# Altium integrated library Wurth Electronik Socket Header 6130xx11821.IntLib: 197 symbols (part 1 of 2) (continued)
## WE-2.54 mm Socket Header 613040143121 (continued)
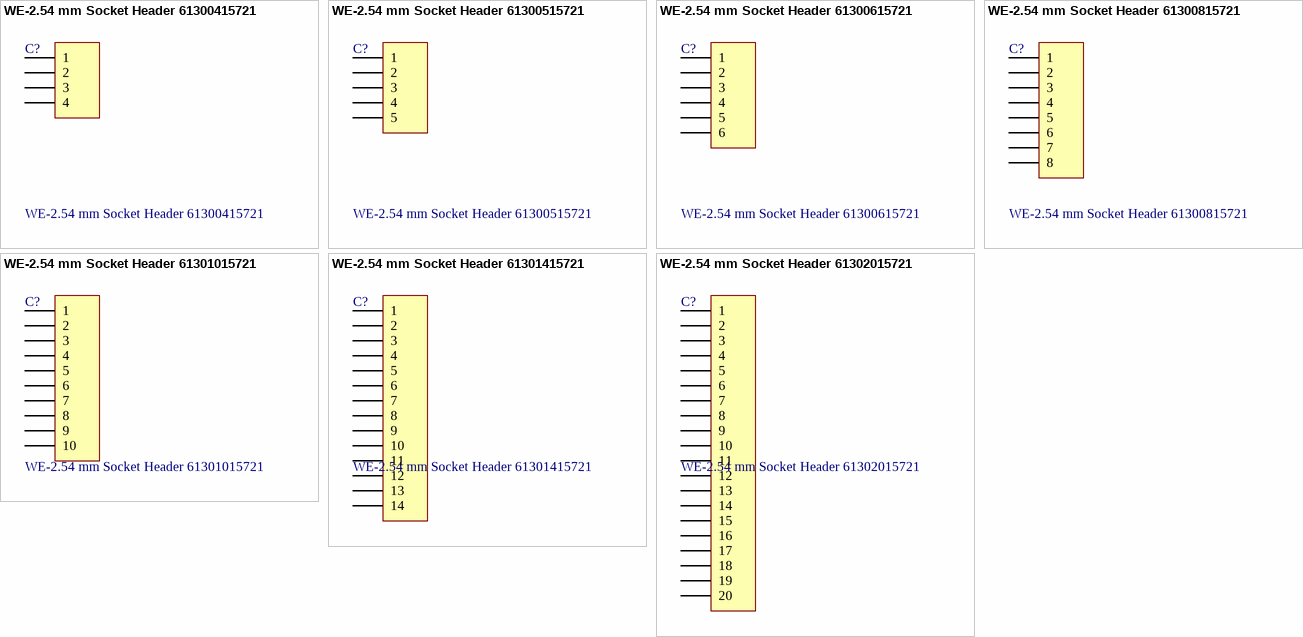
[diagram p9: symbols WE-2.54 mm Socket Header 61300415721 to WE-2.54 mm Socket Header 61302015721]

## WE-2.54 mm Socket Header 61300415721
designator C?
WR-PHD 2.54 mm Socket Header Bottom Entry; Manufacturer: Würth Elektronik eiSos GmbH; ComponentLink1 Description: Manufacturer; ComponentLink2 Description: Datasheet; NoPins: 04; Created Date: 1 April 2013; partNo: 61300415721; ComponentLink1URL: http://www.we-online.com; ComponentLink2URL: http://katalog.we-online.de/em/datasheet/6130xx15721.pdf; Created by: Karrer Zheng
footprint 61300415721 (4 pins, 1 row, straight, gold plating)
pins: 1, 2, 3, 4

## WE-2.54 mm Socket Header 61300515721
designator C?
WR-PHD 2.54 mm Socket Header Bottom Entry; Manufacturer: Würth Elektronik eiSos GmbH; ComponentLink1 Description: Manufacturer; ComponentLink2 Description: Datasheet; NoPins: 05; Created Date: 1 April 2013; partNo: 61300515721; ComponentLink1URL: http://www.we-online.com; ComponentLink2URL: http://katalog.we-online.de/em/datasheet/6130xx15721.pdf; Created by: Karrer Zheng
footprint 61300515721 (5 pins, 1 row, straight, gold plating)
pins: 1, 2, 3, 4, 5

## WE-2.54 mm Socket Header 61300615721
designator C?
WR-PHD 2.54 mm Socket Header Bottom Entry; Manufacturer: Würth Elektronik eiSos GmbH; ComponentLink1 Description: Manufacturer; ComponentLink2 Description: Datasheet; NoPins: 06; Created Date: 1 April 2013; partNo: 61300615721; ComponentLink1URL: http://www.we-online.com; ComponentLink2URL: http://katalog.we-online.de/em/datasheet/6130xx15721.pdf; Created by: Karrer Zheng
footprint 61300615721 (6 pins, 1 row, straight, gold plating)
pins: 1, 2, 3, 4, 5, 6

## WE-2.54 mm Socket Header 61300815721
designator C?
WR-PHD 2.54 mm Socket Header Bottom Entry; Manufacturer: Würth Elektronik eiSos GmbH; ComponentLink1 Description: Manufacturer; ComponentLink2 Description: Datasheet; NoPins: 08; Created Date: 1 April 2013; partNo: 61300815721; ComponentLink1URL: http://www.we-online.com; ComponentLink2URL: http://katalog.we-online.de/em/datasheet/6130xx15721.pdf; Created by: Karrer Zheng
footprint 61300815721 (8 pins, 1 row, straight, gold plating)
pins: 1, 2, 3, 4, 5, 6, 7, 8

## WE-2.54 mm Socket Header 61301015721
designator C?
WR-PHD 2.54 mm Socket Header Bottom Entry; Manufacturer: Würth Elektronik eiSos GmbH; ComponentLink1 Description: Manufacturer; ComponentLink2 Description: Datasheet; NoPins: 10; Created Date: 1 April 2013; partNo: 61301015721; ComponentLink1URL: http://www.we-online.com; ComponentLink2URL: http://katalog.we-online.de/em/datasheet/6130xx15721.pdf; Created by: Karrer Zheng
footprint 61301015721 (10 pins, 1 row, straight, gold plating)
pins: 1, 2, 3, 4, 5, 6, 7, 8, 9, 10

## WE-2.54 mm Socket Header 61301415721
designator C?
WR-PHD 2.54 mm Socket Header Bottom Entry; Manufacturer: Würth Elektronik eiSos GmbH; ComponentLink1 Description: Manufacturer; ComponentLink2 Description: Datasheet; NoPins: 14; Created Date: 1 April 2013; partNo: 61301415721; ComponentLink1URL: http://www.we-online.com; ComponentLink2URL: http://katalog.we-online.de/em/datasheet/6130xx15721.pdf; Created by: Karrer Zheng
footprint 61301415721 (14 pins, 1 row, straight, gold plating)
pins: 1, 2, 3, 4, 5, 6, 7, 8, 9, 10, 11, 12, 13, 14

## WE-2.54 mm Socket Header 61302015721
designator C?
WR-PHD 2.54 mm Socket Header Bottom Entry; Manufacturer: Würth Elektronik eiSos GmbH; ComponentLink1 Description: Manufacturer; ComponentLink2 Description: Datasheet; NoPins: 20; Created Date: 1 April 2013; partNo: 61302015721; ComponentLink1URL: http://www.we-online.com; ComponentLink2URL: http://katalog.we-online.de/em/datasheet/6130xx15721.pdf; Created by: Karrer Zheng
footprint 61302015721 (20 pins, 1 row, straight, gold plating)
pins: 1, 2, 3, 4, 5, 6, 7, 8, 9, 10, 11, 12, 13, 14, 15, 16, 17, 18, 19, 20


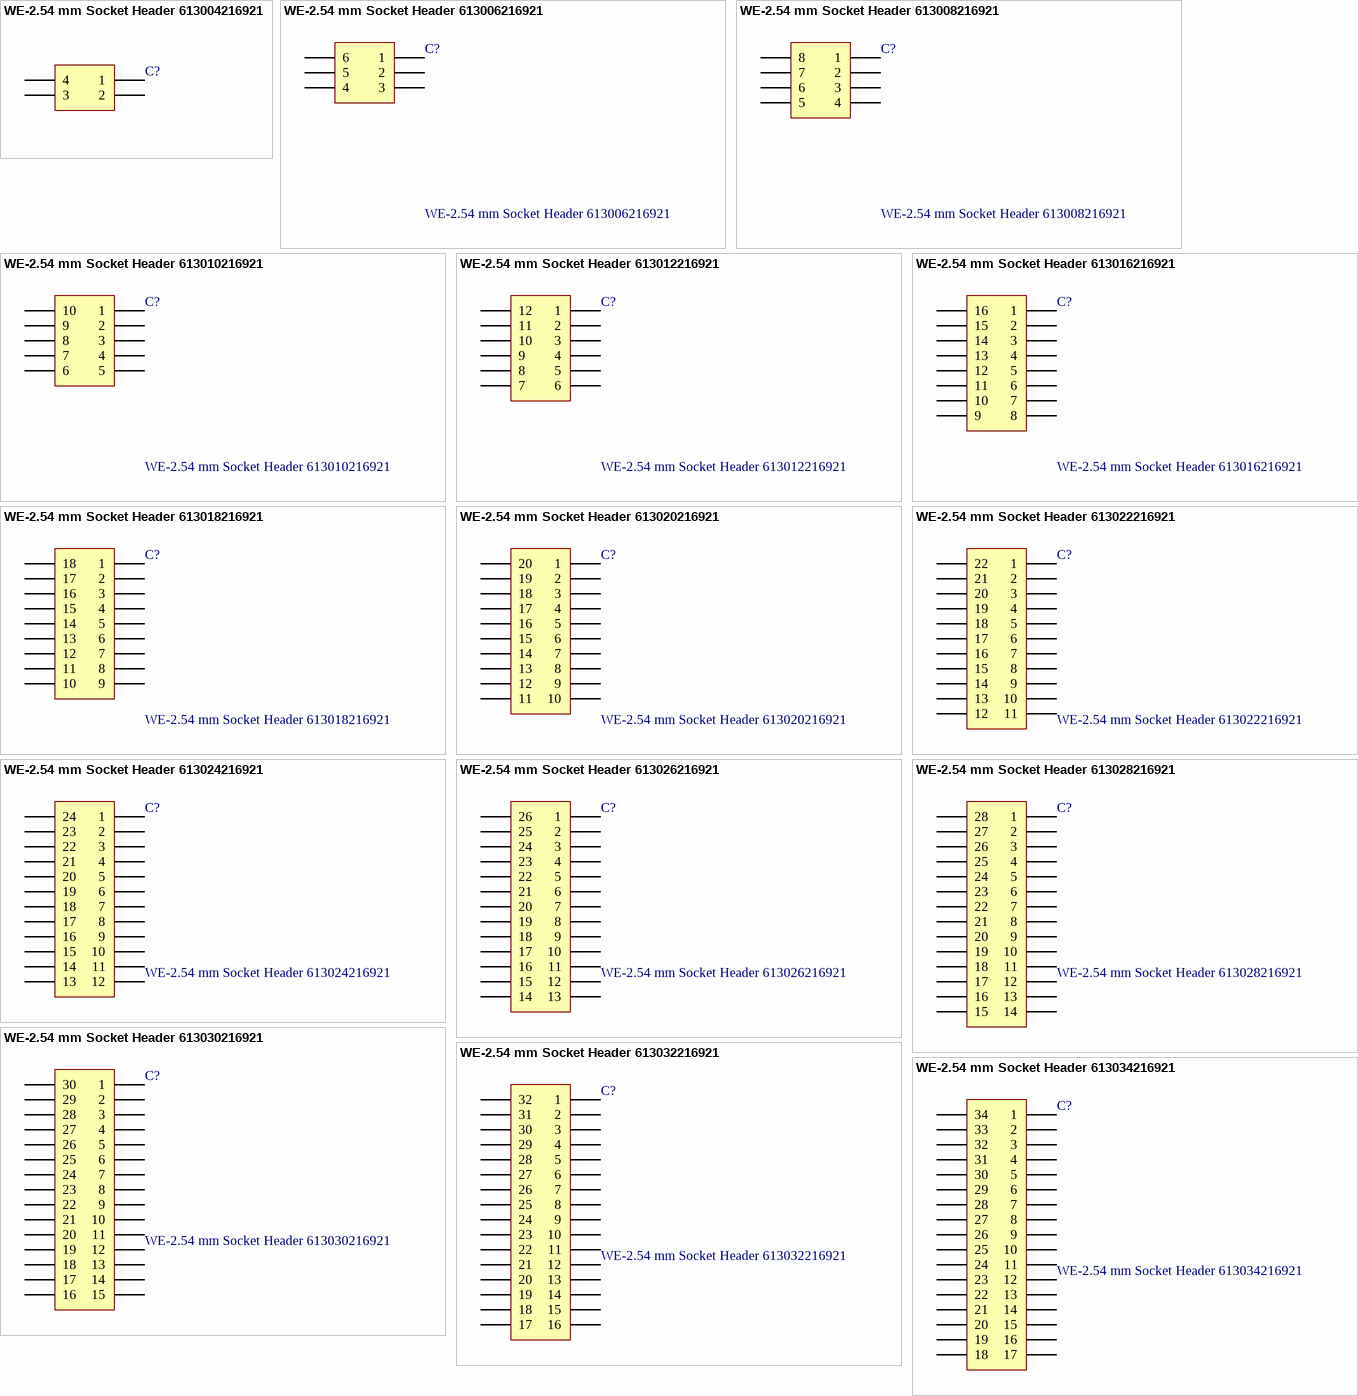
[diagram p10: symbols WE-2.54 mm Socket Header 613004216921 to WE-2.54 mm Socket Header 613034216921]

## WE-2.54 mm Socket Header 613004216921
designator C?
WR-PHD 2.54 mm Dual Socket Header Bottom Entry Large; Manufacturer: Würth Elektronik eiSos GmbH; ComponentLink1 Description: Manufacturer; ComponentLink2 Description: Datasheet; NoPins: 04; Created Date: 29 March 2013; partNo: 613004216921; ComponentLink1URL: http://www.we-online.com; ComponentLink2URL: http://katalog.we-online.de/em/datasheet/6130xx216921.pdf; Created by: Karrer Zheng
footprint 613004216921 (Large, 4 pins, dual row, straight, gold plating)
pins: 1, 2, 3, 4

## WE-2.54 mm Socket Header 613006216921
designator C?
WR-PHD 2.54 mm Dual Socket Header Bottom Entry Large; Manufacturer: Würth Elektronik eiSos GmbH; ComponentLink1 Description: Manufacturer; ComponentLink2 Description: Datasheet; NoPins: 06; Created Date: 29 March 2013; partNo: 613006216921; ComponentLink1URL: http://www.we-online.com; ComponentLink2URL: http://katalog.we-online.de/em/datasheet/6130xx216921.pdf; Created by: Karrer Zheng
footprint 613006216921 (Large, 6 pins, dual row, straight, gold plating)
pins: 1, 2, 3, 4, 5, 6

## WE-2.54 mm Socket Header 613008216921
designator C?
WR-PHD 2.54 mm Dual Socket Header Bottom Entry Large; Manufacturer: Würth Elektronik eiSos GmbH; ComponentLink1 Description: Manufacturer; ComponentLink2 Description: Datasheet; NoPins: 08; Created Date: 29 March 2013; partNo: 613008216921; ComponentLink1URL: http://www.we-online.com; ComponentLink2URL: http://katalog.we-online.de/em/datasheet/6130xx216921.pdf; Created by: Karrer Zheng
footprint 613008216921 (Large, 8 pins, dual row, straight, gold plating)
pins: 1, 2, 3, 4, 5, 6, 7, 8

## WE-2.54 mm Socket Header 613010216921
designator C?
WR-PHD 2.54 mm Dual Socket Header Bottom Entry Large; Manufacturer: Würth Elektronik eiSos GmbH; ComponentLink1 Description: Manufacturer; ComponentLink2 Description: Datasheet; NoPins: 10; Created Date: 29 March 2013; partNo: 613010216921; ComponentLink1URL: http://www.we-online.com; ComponentLink2URL: http://katalog.we-online.de/em/datasheet/6130xx216921.pdf; Created by: Karrer Zheng
footprint 613010216921 (Large, 10 pins, dual row, straight, gold plating)
pins: 1, 2, 3, 4, 5, 6, 7, 8, 9, 10

## WE-2.54 mm Socket Header 613012216921
designator C?
WR-PHD 2.54 mm Dual Socket Header Bottom Entry Large; Manufacturer: Würth Elektronik eiSos GmbH; ComponentLink1 Description: Manufacturer; ComponentLink2 Description: Datasheet; NoPins: 12; Created Date: 29 March 2013; partNo: 613012216921; ComponentLink1URL: http://www.we-online.com; ComponentLink2URL: http://katalog.we-online.de/em/datasheet/6130xx216921.pdf; Created by: Karrer Zheng
footprint 613012216921 (Large, 12 pins, dual row, straight, gold plating)
pins: 1, 2, 3, 4, 5, 6, 7, 8, 9, 10, 11, 12

## WE-2.54 mm Socket Header 613016216921
designator C?
WR-PHD 2.54 mm Dual Socket Header Bottom Entry Large; Manufacturer: Würth Elektronik eiSos GmbH; ComponentLink1 Description: Manufacturer; ComponentLink2 Description: Datasheet; NoPins: 16; Created Date: 29 March 2013; partNo: 613016216921; ComponentLink1URL: http://www.we-online.com; ComponentLink2URL: http://katalog.we-online.de/em/datasheet/6130xx216921.pdf; Created by: Karrer Zheng
footprint 613016216921 (Large, 16 pins, dual row, straight, gold plating)
pins: 1, 2, 3, 4, 5, 6, 7, 8, 9, 10, 11, 12, 13, 14, 15, 16

## WE-2.54 mm Socket Header 613018216921
designator C?
WR-PHD 2.54 mm Dual Socket Header Bottom Entry Large; Manufacturer: Würth Elektronik eiSos GmbH; ComponentLink1 Description: Manufacturer; ComponentLink2 Description: Datasheet; NoPins: 18; Created Date: 29 March 2013; partNo: 613018216921; ComponentLink1URL: http://www.we-online.com; ComponentLink2URL: http://katalog.we-online.de/em/datasheet/6130xx216921.pdf; Created by: Karrer Zheng
footprint 613018216921 (Large, 18 pins, dual row, straight, gold plating)
pins: 1, 2, 3, 4, 5, 6, 7, 8, 9, 10, 11, 12, 13, 14, 15, 16, 17, 18

## WE-2.54 mm Socket Header 613020216921
designator C?
WR-PHD 2.54 mm Dual Socket Header Bottom Entry Large; Manufacturer: Würth Elektronik eiSos GmbH; ComponentLink1 Description: Manufacturer; ComponentLink2 Description: Datasheet; NoPins: 20; Created Date: 29 March 2013; partNo: 613020216921; ComponentLink1URL: http://www.we-online.com; ComponentLink2URL: http://katalog.we-online.de/em/datasheet/6130xx216921.pdf; Created by: Karrer Zheng
footprint 613020216921 (Large, 20 pins, dual row, straight, gold plating)
pins: 1, 2, 3, 4, 5, 6, 7, 8, 9, 10, 11, 12, 13, 14, 15, 16, 17, 18, 19, 20

## WE-2.54 mm Socket Header 613022216921
designator C?
WR-PHD 2.54 mm Dual Socket Header Bottom Entry Large; Manufacturer: Würth Elektronik eiSos GmbH; ComponentLink1 Description: Manufacturer; ComponentLink2 Description: Datasheet; NoPins: 22; Created Date: 29 March 2013; partNo: 613022216921; ComponentLink1URL: http://www.we-online.com; ComponentLink2URL: http://katalog.we-online.de/em/datasheet/6130xx216921.pdf; Created by: Karrer Zheng
footprint 613022216921 (Large, 22 pins, dual row, straight, gold plating)
pins: 1, 2, 3, 4, 5, 6, 7, 8, 9, 10, 11, 12, 13, 14, 15, 16, 17, 18, 19, 20, 21, 22

## WE-2.54 mm Socket Header 613024216921
designator C?
WR-PHD 2.54 mm Dual Socket Header Bottom Entry Large; Manufacturer: Würth Elektronik eiSos GmbH; ComponentLink1 Description: Manufacturer; ComponentLink2 Description: Datasheet; NoPins: 24; Created Date: 29 March 2013; partNo: 613024216921; ComponentLink1URL: http://www.we-online.com; ComponentLink2URL: http://katalog.we-online.de/em/datasheet/6130xx216921.pdf; Created by: Karrer Zheng
footprint 613024216921 (Large, 24 pins, dual row, straight, gold plating)
pins: 1, 2, 3, 4, 5, 6, 7, 8, 9, 10, 11, 12, 13, 14, 15, 16, 17, 18, 19, 20, 21, 22, 23, 24

## WE-2.54 mm Socket Header 613026216921
designator C?
WR-PHD 2.54 mm Dual Socket Header Bottom Entry Large; Manufacturer: Würth Elektronik eiSos GmbH; ComponentLink1 Description: Manufacturer; ComponentLink2 Description: Datasheet; NoPins: 26; Created Date: 29 March 2013; partNo: 613026216921; ComponentLink1URL: http://www.we-online.com; ComponentLink2URL: http://katalog.we-online.de/em/datasheet/6130xx216921.pdf; Created by: Karrer Zheng
footprint 613026216921 (Large,26 pins, dual row, straight, gold plating)
pins: 1, 2, 3, 4, 5, 6, 7, 8, 9, 10, 11, 12, 13, 14, 15, 16, 17, 18, 19, 20, 21, 22, 23, 24, 25, 26

## WE-2.54 mm Socket Header 613028216921
designator C?
WR-PHD 2.54 mm Dual Socket Header Bottom Entry Large; Manufacturer: Würth Elektronik eiSos GmbH; ComponentLink1 Description: Manufacturer; ComponentLink2 Description: Datasheet; NoPins: 28; Created Date: 29 March 2013; partNo: 613028216921; ComponentLink1URL: http://www.we-online.com; ComponentLink2URL: http://katalog.we-online.de/em/datasheet/6130xx216921.pdf; Created by: Karrer Zheng
footprint 613028216921 (Large, 28 pins, dual row, straight, gold plating)
pins: 1, 2, 3, 4, 5, 6, 7, 8, 9, 10, 11, 12, 13, 14, 15, 16, 17, 18, 19, 20, 21, 22, 23, 24, 25, 26, 27, 28

## WE-2.54 mm Socket Header 613030216921
designator C?
WR-PHD 2.54 mm Dual Socket Header Bottom Entry Large; Manufacturer: Würth Elektronik eiSos GmH; ComponentLink1 Description: Manufacturer; ComponentLink2 Description: Datasheet; NoPins: 30; Created Date: 29 March 2013; partNo: 613030216921; ComponentLink1URL: http://www.we-online.com; ComponentLink2URL: http://katalog.we-online.de/em/datasheet/6130xx216921.pdf; Created by: Karrer Zheng
footprint 613030216921 (Large, 30 pins, dual row, straight, gold plating)
pins: 1, 2, 3, 4, 5, 6, 7, 8, 9, 10, 11, 12, 13, 14, 15, 16, 17, 18, 19, 20, 21, 22, 23, 24, 25, 26, 27, 28, 29, 30

## WE-2.54 mm Socket Header 613032216921
designator C?
WR-PHD 2.54 mm Dual Socket Header Bottom Entry Large; Manufacturer: Würth Elektronik eiSos GmbH; ComponentLink1 Description: Manufacturer; ComponentLink2 Description: Datasheet; NoPins: 32; Created Date: 29 March 2013; partNo: 613032216921; ComponentLink1URL: http://www.we-online.com; ComponentLink2URL: http://katalog.we-online.de/em/datasheet/6130xx216921.pdf; Created by: Karrer Zheng
footprint 613032216921 (Large, 32 pins, dual row, straight, gold plating)
pins: 1, 2, 3, 4, 5, 6, 7, 8, 9, 10, 11, 12, 13, 14, 15, 16, 17, 18, 19, 20, 21, 22, 23, 24, 25, 26, 27, 28, 29, 30, 31, 32

## WE-2.54 mm Socket Header 613034216921
designator C?
WR-PHD 2.54 mm Dual Socket Header Bottom Entry Large; Manufacturer: Würth Elektronik eiSos GmbH; ComponentLink1 Description: Manufacturer; ComponentLink2 Description: Datasheet; NoPins: 34; Created Date: 29 March 2013; partNo: 613034216921; ComponentLink1URL: http://www.we-online.com; ComponentLink2URL: http://katalog.we-online.de/em/datasheet/6130xx216921.pdf; Created by: Karrer Zheng
footprint 613034216921 (Large, 34 pins, dual row, straight, gold plating)
pins: 1, 2, 3, 4, 5, 6, 7, 8, 9, 10, 11, 12, 13, 14, 15, 16, 17, 18, 19, 20, 21, 22, 23, 24, 25, 26, 27, 28, 29, 30, 31, 32, 33, 34

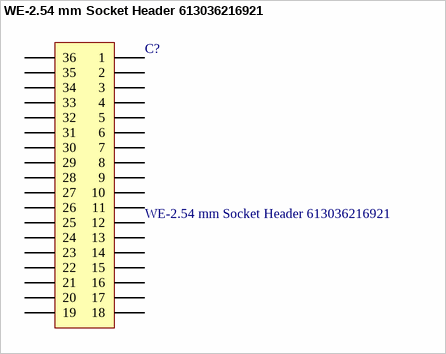
[diagram p11: symbol WE-2.54 mm Socket Header 613036216921]

## WE-2.54 mm Socket Header 613036216921
designator C?
WR-PHD 2.54 mm Dual Socket Header Bottom Entry Large; Manufacturer: Würth Elektronik eiSos GmbH; ComponentLink1 Description: Manufacturer; ComponentLink2 Description: Datasheet; NoPins: 36; Created Date: 29 March 2013; partNo: 613036216921; ComponentLink1URL: http://www.we-online.com; ComponentLink2URL: http://katalog.we-online.de/em/datasheet/6130xx216921.pdf; Created by: Karrer Zheng
footprint 613036216921 (Large, 36 pins, dual row, straight, gold plating)
pins: 1, 2, 3, 4, 5, 6, 7, 8, 9, 10, 11, 12, 13, 14, 15, 16, 17, 18, 19, 20, 21, 22, 23, 24, 25, 26, 27, 28, 29, 30, 31, 32, 33, 34, 35, 36


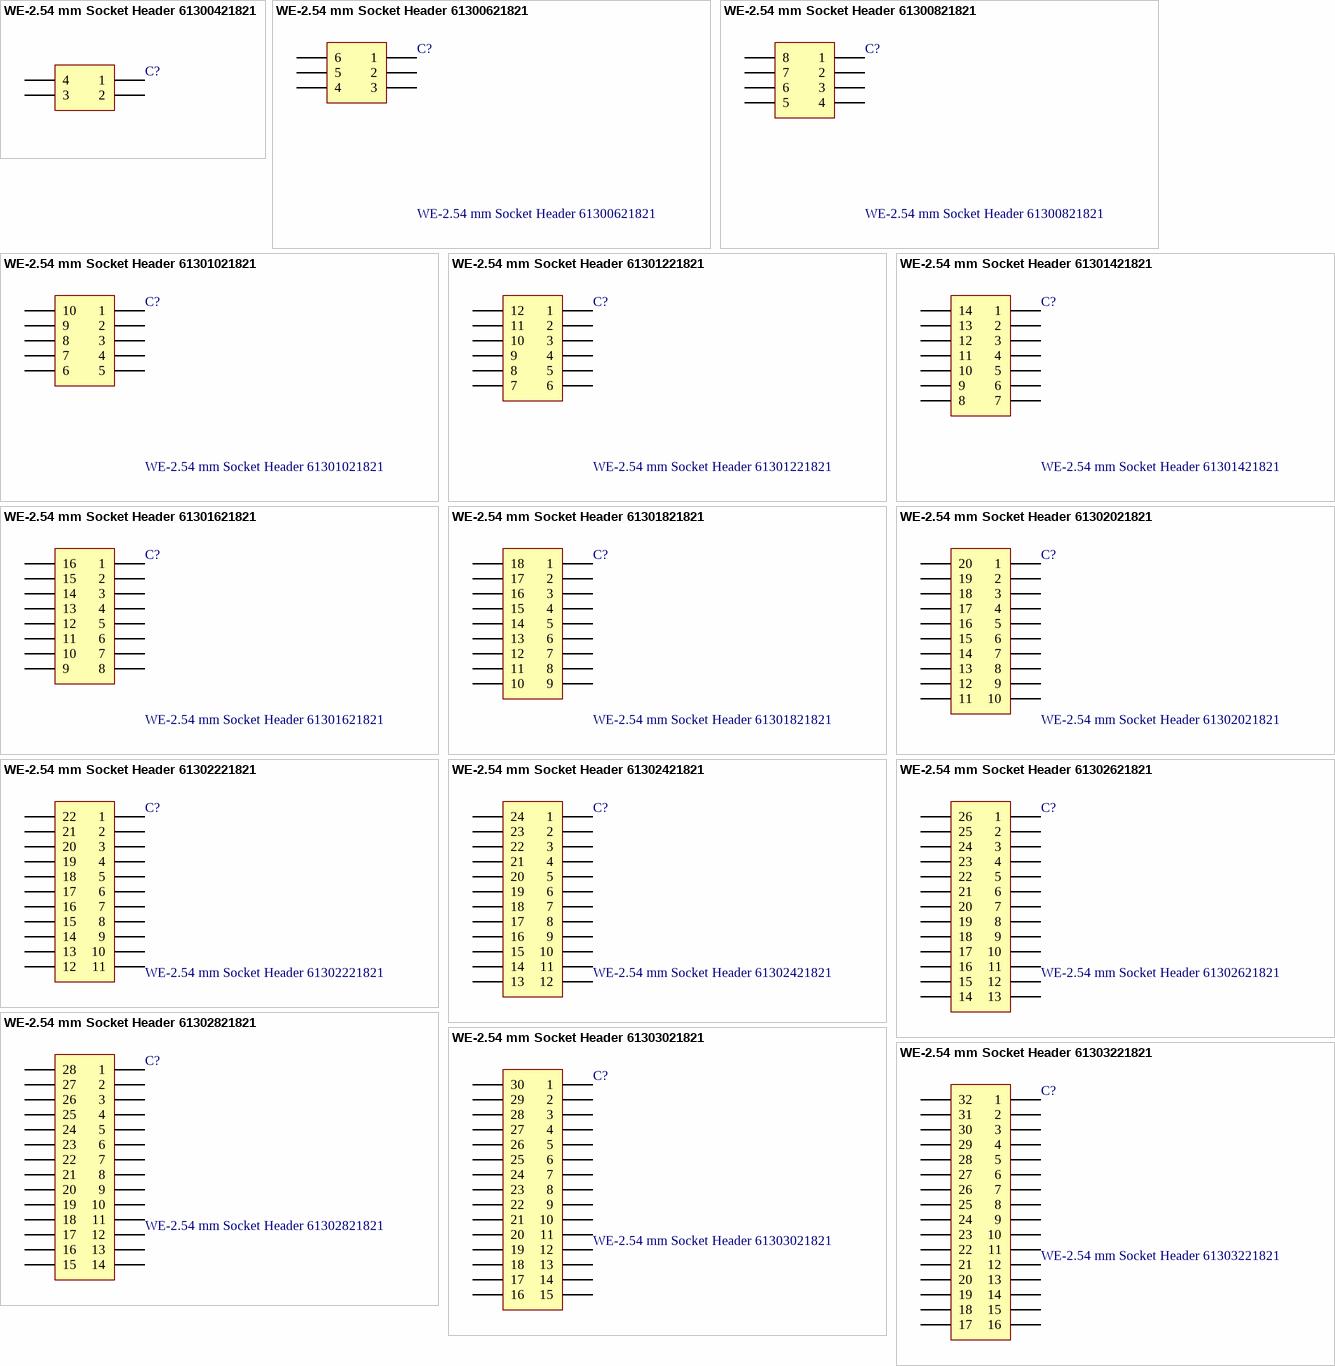
[diagram p12: symbols WE-2.54 mm Socket Header 61300421821 to WE-2.54 mm Socket Header 61303221821]

## WE-2.54 mm Socket Header 61300421821
designator C?
WR-PHD 2.54 mm Dual Socket Header; Manufacturer: Würth Elektronik eiSos GmbH; ComponentLink1 Description: Manufacturer; ComponentLink2 Description: Datasheet; NoPins: 04; Created Date: 29 March 2013; partNo: 61300421821; ComponentLink1URL: http://www.we-online.com; ComponentLink2URL: http://katalog.we-online.de/em/datasheet/6130xx21821.pdf; Created by: Karrer Zheng
footprint 61300421821 (4 pins, dual row, straight, gold plating)
pins: 1, 2, 3, 4

## WE-2.54 mm Socket Header 61300621821
designator C?
WR-PHD 2.54 mm Dual Socket Header; Manufacturer: Würth Elektronik eiSos GmbH; ComponentLink1 Description: Manufacturer; ComponentLink2 Description: Datasheet; NoPins: 06; Created Date: 29 March 2013; partNo: 61300621821; ComponentLink1URL: http://www.we-online.com; ComponentLink2URL: http://katalog.we-online.de/em/datasheet/6130xx21821.pdf; Created by: Karrer Zheng
footprint 61300621821 (6 pins, dual row, straight, gold plating)
pins: 1, 2, 3, 4, 5, 6

## WE-2.54 mm Socket Header 61300821821
designator C?
WR-PHD 2.54 mm Dual Socket Header; Manufacturer: Würth Elektronik eiSos GmbH; ComponentLink1 Description: Manufacturer; ComponentLink2 Description: Datasheet; NoPins: 08; Created Date: 29 March 2013; partNo: 61300821821; ComponentLink1URL: http://www.we-online.com; ComponentLink2URL: http://katalog.we-online.de/em/datasheet/6130xx21821.pdf; Created by: Karrer Zheng
footprint 61300821821 (8 pins, dual row, straight, gold plating)
pins: 1, 2, 3, 4, 5, 6, 7, 8

## WE-2.54 mm Socket Header 61301021821
designator C?
WR-PHD 2.54 mm Dual Socket Header; Manufacturer: Würth Elektronik eiSos GmbH; ComponentLink1 Description: Manufacturer; ComponentLink2 Description: Datasheet; NoPins: 10; Created Date: 29 March 2013; partNo: 61301021821; ComponentLink1URL: http://www.we-online.com; ComponentLink2URL: http://katalog.we-online.de/em/datasheet/6130xx21821.pdf; Created by: Karrer Zheng
footprint 61301021821 (10 pins, dual row, straight, gold plating)
pins: 1, 2, 3, 4, 5, 6, 7, 8, 9, 10

## WE-2.54 mm Socket Header 61301221821
designator C?
WR-PHD 2.54 mm Dual Socket Header; Manufacturer: Würth Elektronik eiSos GmbH; ComponentLink1 Description: Manufacturer; ComponentLink2 Description: Datasheet; NoPins: 12; Created Date: 29 March 2013; partNo: 61301221821; ComponentLink1URL: http://www.we-online.com; ComponentLink2URL: http://katalog.we-online.de/em/datasheet/6130xx21821.pdf; Created by: Karrer Zheng
footprint 61301221821 (12 pins, dual row, straight, gold plating)
pins: 1, 2, 3, 4, 5, 6, 7, 8, 9, 10, 11, 12

## WE-2.54 mm Socket Header 61301421821
designator C?
WR-PHD 2.54 mm Dual Socket Header; Manufacturer: Würth Elektronik eiSos GmbH; ComponentLink1 Description: Manufacturer; ComponentLink2 Description: Datasheet; NoPins: 14; Created Date: 29 March 2013; partNo: 61301421821; ComponentLink1URL: http://www.we-online.com; ComponentLink2URL: http://katalog.we-online.de/em/datasheet/6130xx21821.pdf; Created by: Karrer Zheng
footprint 61301421821 (14 pins, dual row, straight, gold plating)
pins: 1, 2, 3, 4, 5, 6, 7, 8, 9, 10, 11, 12, 13, 14

## WE-2.54 mm Socket Header 61301621821
designator C?
WR-PHD 2.54 mm Dual Socket Header; Manufacturer: Würth Elektronik eiSos GmbH; ComponentLink1 Description: Manufacturer; ComponentLink2 Description: Datasheet; NoPins: 16; Created Date: 29 March 2013; partNo: 61301621821; ComponentLink1URL: http://www.we-online.com; ComponentLink2URL: http://katalog.we-online.de/em/datasheet/6130xx21821.pdf; Created by: Karrer Zheng
footprint 61301621821 (16 pins, dual row, straight, gold plating)
pins: 1, 2, 3, 4, 5, 6, 7, 8, 9, 10, 11, 12, 13, 14, 15, 16

## WE-2.54 mm Socket Header 61301821821
designator C?
WR-PHD 2.54 mm Dual Socket Header; Manufacturer: Würth Elektronik eiSos GmbH; ComponentLink1 Description: Manufacturer; ComponentLink2 Description: Datasheet; NoPins: 18; Created Date: 29 March 2013; partNo: 61301821821; ComponentLink1URL: http://www.we-online.com; ComponentLink2URL: http://katalog.we-online.de/em/datasheet/6130xx21821.pdf; Created by: Karrer Zheng
footprint 61301821821 (18 pins, dual row, straight, gold plating)
pins: 1, 2, 3, 4, 5, 6, 7, 8, 9, 10, 11, 12, 13, 14, 15, 16, 17, 18

## WE-2.54 mm Socket Header 61302021821
designator C?
WR-PHD 2.54 mm Dual Socket Header; Manufacturer: Würth Elektronik eiSos GmbH; ComponentLink1 Description: Manufacturer; ComponentLink2 Description: Datasheet; NoPins: 20; Created Date: 29 March 2013; partNo: 61302021821; ComponentLink1URL: http://www.we-online.com; ComponentLink2URL: http://katalog.we-online.de/em/datasheet/6130xx21821.pdf; Created by: Karrer Zheng
footprint 61302021821 (20 pins, dual row, straight, gold plating)
pins: 1, 2, 3, 4, 5, 6, 7, 8, 9, 10, 11, 12, 13, 14, 15, 16, 17, 18, 19, 20

## WE-2.54 mm Socket Header 61302221821
designator C?
WR-PHD 2.54 mm Dual Socket Header; Manufacturer: Würth Elektronik eiSos GmbH; ComponentLink1 Description: Manufacturer; ComponentLink2 Description: Datasheet; NoPins: 22; Created Date: 29 March 2013; partNo: 61302221821; ComponentLink1URL: http://www.we-online.com; ComponentLink2URL: http://katalog.we-online.de/em/datasheet/6130xx21821.pdf; Created by: Karrer Zheng
footprint 61302221821 (22 pins, dual row, straight, gold plating)
pins: 1, 2, 3, 4, 5, 6, 7, 8, 9, 10, 11, 12, 13, 14, 15, 16, 17, 18, 19, 20, 21, 22

## WE-2.54 mm Socket Header 61302421821
designator C?
WR-PHD 2.54 mm Dual Socket Header; Manufacturer: Würth Elektronik eiSos GmbH; ComponentLink1 Description: Manufacturer; ComponentLink2 Description: Datasheet; NoPins: 24; Created Date: 29 March 2013; partNo: 61302421821; ComponentLink1URL: http://www.we-online.com; ComponentLink2URL: http://katalog.we-online.de/em/datasheet/6130xx21821.pdf; Created by: Karrer Zheng
footprint 61302421821 (24 pins, dual row, straight, gold plating)
pins: 1, 2, 3, 4, 5, 6, 7, 8, 9, 10, 11, 12, 13, 14, 15, 16, 17, 18, 19, 20, 21, 22, 23, 24